# Altium footprint library lamp_controller.PcbLib: 67 footprints (part 3 of 5)
Each footprint in its own frame and in the unit in brackets; x right, y up, seen from the top. Pads: shape width x height; smd on the part's side, far side on the other; paste and mask are expansions set on the pad; w line width, h text height; cw(c..) or ccw(c..) is an arc to the next point about the centre after c.
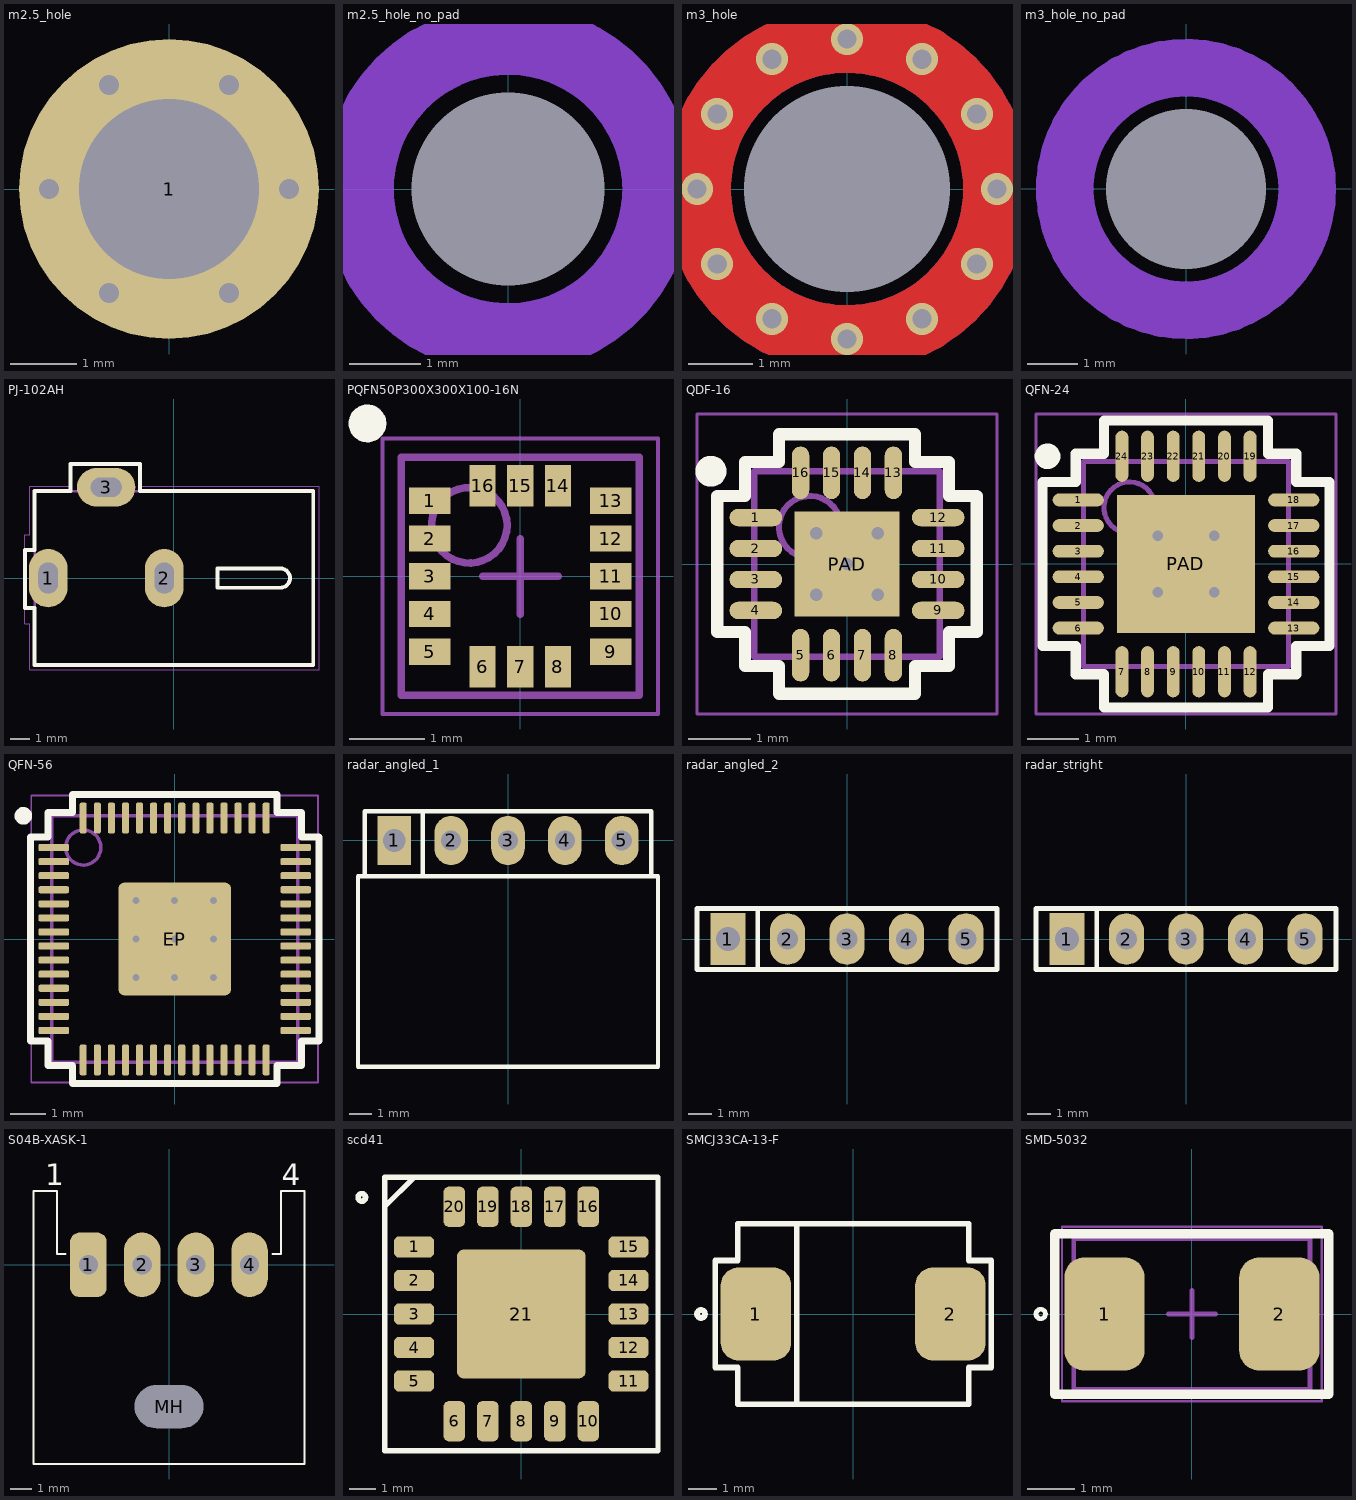
[diagram p2: the footprints below, top view; thin cyan lines are the x and y axes]

## m2.5_hole [mm] "M2.5 hole, with via stitching"
pads (1):
  round 4.5 hole 2.7 unplated mask+1.25: 1(0,0)
via -0.9,-1.559 diameter 0.5 hole 0.3
via 0.9,-1.559 diameter 0.5 hole 0.3
via 1.8,0 diameter 0.5 hole 0.3
via 0.9,1.559 diameter 0.5 hole 0.3
via -0.9,1.559 diameter 0.5 hole 0.3
via -1.8,0 diameter 0.5 hole 0.3

## m2.5_hole_no_pad [mm] "M2.5 hole, no pad"
pads (1):
  round 0 hole 2.7 unplated mask+1.25: ""(0,0)
Top Layer keep-out:
  circle w1: c0,0 r2.1
Bottom Layer keep-out:
  circle w1: c0,0 r2.1

## m3_hole [mm] "M3 hole, with via stitching"
pads (2):
  round 0.1 smd: 1(0,-2.2)
  round 0 hole 3.2 unplated mask+1.25: 1(0,0)
via 0,2.33 diameter 0.5 hole 0.3
via 0,-2.33 diameter 0.5 hole 0.3
via 2.018,1.165 diameter 0.5 hole 0.3
via -2.018,-1.165 diameter 0.5 hole 0.3
via -2.018,1.165 diameter 0.5 hole 0.3
via 2.018,-1.165 diameter 0.5 hole 0.3
via 1.165,2.018 diameter 0.5 hole 0.3
via -1.165,-2.018 diameter 0.5 hole 0.3
via 2.33,0 diameter 0.5 hole 0.3
via -2.33,0 diameter 0.5 hole 0.3
via -1.165,2.018 diameter 0.5 hole 0.3
via 1.165,-2.018 diameter 0.5 hole 0.3
Top Layer:
  circle w1.05: c0,0 r2.33
Bottom Layer:
  circle w1.05: c0,0 r2.33
Multi-Layer:
  pour cut-out: 0,-1.8 0.177,-1.8 0.526,-1.731 0.854,-1.596 1.149,-1.399 1.4,-1.148 1.598,-0.853 1.734,-0.525 1.803,-0.177 1.803,0 1.8,0 1.8,0.177 1.731,0.525 1.596,0.852 1.4,1.147 1.149,1.397 0.855,1.595 0.528,1.73 0.18,1.8 0.003,1.8 0,1.8 -0.177,1.8 -0.524,1.73 -0.852,1.595 -1.146,1.397 -1.396,1.147 -1.593,0.852 -1.728,0.525 -1.797,0.177 -1.797,0 -1.8,0 -1.8,-0.177 -1.73,-0.525 -1.594,-0.853 -1.397,-1.148 -1.146,-1.399 -0.85,-1.596 -0.522,-1.731 -0.174,-1.8 0.003,-1.8

## m3_hole_no_pad [mm] "M3 hole, no pad"
pads (1):
  round 0 hole 3.2 unplated mask+1.3: ""(0,0)
Top Layer keep-out:
  circle w1.15: c0,0 r2.425
Bottom Layer keep-out:
  circle w1.15: c0,0 r2.425
Multi-Layer:
  pour cut-out: 0,-3 0.197,-3 0.586,-2.949 0.966,-2.847 1.33,-2.696 1.67,-2.5 1.982,-2.26 2.26,-1.982 2.5,-1.67 2.696,-1.33 2.847,-0.966 2.949,-0.587 3,-0.197 3,0 3,0.197 2.949,0.586 2.847,0.966 2.696,1.33 2.5,1.67 2.26,1.982 1.982,2.26 1.67,2.5 1.33,2.696 0.966,2.847 0.586,2.949 0.197,3 0,3 -0.197,3 -0.587,2.949 -0.966,2.847 -1.33,2.696 -1.67,2.5 -1.982,2.26 -2.26,1.982 -2.5,1.67 -2.696,1.33 -2.847,0.966 -2.949,0.587 -3,0.197 -3,0 -3,-0.197 -2.949,-0.587 -2.847,-0.966 -2.696,-1.33 -2.5,-1.67 -2.26,-1.982 -1.982,-2.26 -1.67,-2.5 -1.33,-2.696 -0.966,-2.847 -0.587,-2.949 -0.197,-3

## PJ-102AH [mm]
height 11
pads (3):
  oval 2x3.016 hole 1 slot 1.6 at 90 deg: 1(-6.5,0) 2(-0.5,0)
  oval 3.016x2 hole 1 slot 1.6 at 0 deg: 3(-3.5,4.7)
Top Overlay:
  lines w0.2: 5.5,0.5 cw(c5.5,0) 6,0 cw(c5.5,0) 5.5,-0.5 2.25,-0.5 2.25,0.5 5.5,0.5 ; 5.5,0.5 5.5,0.5 ; -7.7,-1.55 -7.2,-1.55 -7.2,-4.5 7.2,-4.5 7.2,4.5 -1.75,4.5 -1.75,5.9 -5.35,5.9 -5.35,4.5 -7.2,4.5 -7.2,1.45 -7.7,1.45 -7.7,-1.55
Mechanical 1:
  lines w0: -7,-0.8 -6,-0.8 -6,0.8 -7,0.8 -7,-0.8 ; -4.3,4.2 -4.3,5.2 -2.7,5.2 -2.7,4.2 -4.3,4.2 ; -1,-0.8 0,-0.8 0,0.8 -1,0.8 -1,-0.8
Mechanical 13:
  lines w0.127: -7.2,-4.5 7.2,-4.5 ; -7.2,-4.5 -7.2,4.5 ; -7.2,-4.5 7.2,-4.5 ; -7.2,-4.5 -7.2,4.5 ; -7.2,4.5 7.2,4.5 ; -7.2,4.5 7.2,4.5 ; 7.2,-4.5 7.2,4.5 ; 7.2,-4.5 7.2,4.5
Mechanical 15:
  lines w0.05: -7.7,-2.35 -7.7,2.25 -7.45,2.25 -7.45,4.75 -5.35,4.75 -5.35,5.9 -1.65,5.9 -1.65,4.75 7.5,4.75 7.5,-4.75 -7.45,-4.75 -7.45,-2.35 -7.7,-2.35
3D body "pj-102ah.sldprt": height 11, standoff -3.5, extent -7.2,-4.5 7.2,4.9

## PQFN50P300X300X100-16N [mm] "PQFN, 16-Leads, Body 3.00x3.00mm, Pitch 0.50mm, IPC Medium Density"
height 1
pads (16):
  rect 0.55x0.35 smd: 1(-1.2,1) 2(-1.2,0.5) 3(-1.2,0) 4(-1.2,-0.5) 5(-1.2,-1) 9(1.2,-1) 10(1.2,-0.5) 11(1.2,0) 12(1.2,0.5) 13(1.2,1)
  rect 0.35x0.55 smd: 6(-0.5,-1.2) 7(0,-1.2) 8(0.5,-1.2) 14(0.5,1.2) 15(0,1.2) 16(-0.5,1.2)
Top Overlay:
  circle w0.25: c-2.025,2.025 r0.125
Top Courtyard:
  lines w0.05: -1.825,-1.825 1.825,-1.825 1.825,1.825 -1.825,1.825 -1.825,-1.825
  lines w0.1: -0.5,0 0.5,0 ; 0,-0.5 0,0.5
Mechanical 13:
  circle w0.1: c-0.675,0.675 r0.5
  lines w0.1: -1.575,-1.575 1.575,-1.575 1.575,1.575 -1.575,1.575 -1.575,-1.575
3D body: height 1, standoff 0, extent -1.575,-1.575 1.575,1.575

## QDF-16 [mm] "QFN, 16-Leads, Body 3.00x3.00mm, Pitch 0.50mm, Thermal Pad 1.70x1.70mm, IPC Low Density"
height 0.8
pads (17):
  oval 0.85x0.28 smd: 1(-1.475,0.75) 2(-1.475,0.25) 3(-1.475,-0.25) 4(-1.475,-0.75) 9(1.475,-0.75) 10(1.475,-0.25) 11(1.475,0.25) 12(1.475,0.75)
  oval 0.28x0.85 smd: 5(-0.75,-1.475) 6(-0.25,-1.475) 7(0.25,-1.475) 8(0.75,-1.475) 13(0.75,1.475) 14(0.25,1.475) 15(-0.25,1.475) 16(-0.75,1.475)
  rect 1.7x1.7 smd: PAD(0,0)
via 0,0 diameter 0.45 hole 0.2
via 0.5,0.5 diameter 0.45 hole 0.2
via 0.5,-0.5 diameter 0.45 hole 0.2
via -0.5,-0.5 diameter 0.45 hole 0.2
via -0.5,0.5 diameter 0.45 hole 0.2
Top Overlay:
  circle w0.25: c-2.2,1.5 r0.125
  lines w0.2: -2.1,-1.1 -1.65,-1.1 -1.65,-1.65 -1.1,-1.65 -1.1,-2.1 1.1,-2.1 1.1,-1.65 1.65,-1.65 1.65,-1.1 2.1,-1.1 2.1,1.1 1.65,1.1 1.65,1.65 1.1,1.65 1.1,2.1 -1.1,2.1 -1.1,1.65 -1.65,1.65 -1.65,1.1 -2.1,1.1 -2.1,-1.1
Top Courtyard:
  lines w0.05: -2.425,-2.425 2.425,-2.425 2.425,2.425 -2.425,2.425 -2.425,-2.425
  lines w0.1: -0.5,0 0.5,0 ; 0,-0.5 0,0.5
Mechanical 13:
  circle w0.1: c-0.6,0.6 r0.5
  lines w0.1: -1.5,-1.5 1.5,-1.5 1.5,1.5 -1.5,1.5 -1.5,-1.5
3D body "QDF-16.step": height 0.8, standoff 0, extent -1.501,-1.501 1.501,1.501

## QFN-24 [mm] "QFN, 24-Leads, Body 4.00x4.00mm, Pitch 0.50mm, Thermal Pad 2.70x2.70mm, IPC Low Density"
height 1
pads (25):
  oval 1x0.25 smd: 1(-2.1,1.25) 2(-2.1,0.75) 3(-2.1,0.25) 4(-2.1,-0.25) 5(-2.1,-0.75) 6(-2.1,-1.25) 13(2.1,-1.25) 14(2.1,-0.75) 15(2.1,-0.25) 16(2.1,0.25) 17(2.1,0.75) 18(2.1,1.25)
  oval 0.25x1 smd: 7(-1.25,-2.1) 8(-0.75,-2.1) 9(-0.25,-2.1) 10(0.25,-2.1) 11(0.75,-2.1) 12(1.25,-2.1) 19(1.25,2.1) 20(0.75,2.1) 21(0.25,2.1) 22(-0.25,2.1) 23(-0.75,2.1) 24(-1.25,2.1)
  rect 2.7x2.7 smd: PAD(0,0)
via -0.55,0.55 diameter 0.45 hole 0.2
via 0.55,0.55 diameter 0.45 hole 0.2
via -0.55,-0.55 diameter 0.45 hole 0.2
via 0.55,-0.55 diameter 0.45 hole 0.2
Top Overlay:
  circle w0.25: c-2.7,2.1 r0.125
  lines w0.2: -2.8,-1.6 -2.8,1.6 -2.15,1.6 -2.15,2.15 -1.6,2.15 -1.6,2.8 1.6,2.8 1.6,2.15 2.15,2.15 2.15,1.6 2.8,1.6 2.8,-1.6 2.15,-1.6 2.15,-2.15 1.6,-2.15 1.6,-2.8 -1.6,-2.8 -1.6,-2.15 -2.15,-2.15 -2.15,-1.6 -2.8,-1.6
Top Courtyard:
  lines w0.05: -2.925,-2.925 -2.925,2.925 2.925,2.925 2.925,-2.925 -2.925,-2.925
  lines w0.1: -0.5,0 0.5,0 ; 0,-0.5 0,0.5
Mechanical 13:
  circle w0.1: c-1.1,1.1 r0.5
  lines w0.1: -2,-2 -2,2 2,2 2,-2 -2,-2
3D body "stusb4500.step": height 1.01, standoff 0.01, extent -2,-2 2,2

## QFN-56 [mm]
height 0.9
pads (57):
  rrect50% 0.875x0.2 smd: 1(-3.437,2.6) 2(-3.437,2.2) 3(-3.437,1.8) 4(-3.437,1.4) 5(-3.437,1) 6(-3.437,0.6) 7(-3.437,0.2) 8(-3.437,-0.2) 9(-3.437,-0.6) 10(-3.437,-1) 11(-3.437,-1.4) 12(-3.437,-1.8) 13(-3.437,-2.2) 14(-3.437,-2.6) 29(3.438,-2.6) 30(3.438,-2.2) 31(3.438,-1.8) 32(3.438,-1.4) 33(3.438,-1) 34(3.438,-0.6) 35(3.438,-0.2) 36(3.438,0.2) 37(3.438,0.6) 38(3.438,1) 39(3.438,1.4) 40(3.438,1.8) 41(3.438,2.2) 42(3.438,2.6)
  rrect50% 0.2x0.875 smd: 15(-2.6,-3.438) 16(-2.2,-3.438) 17(-1.8,-3.438) 18(-1.4,-3.438) 19(-1,-3.438) 20(-0.6,-3.438) 21(-0.2,-3.438) 22(0.2,-3.438) 23(0.6,-3.438) 24(1,-3.438) 25(1.4,-3.438) 26(1.8,-3.438) 27(2.2,-3.438) 28(2.6,-3.438) 43(2.6,3.437) 44(2.2,3.437) 45(1.8,3.437) 46(1.4,3.437) 47(1,3.437) 48(0.6,3.437) 49(0.2,3.437) 50(-0.2,3.437) 51(-0.6,3.437) 52(-1,3.437) 53(-1.4,3.437) 54(-1.8,3.437) 55(-2.2,3.437) 56(-2.6,3.437)
  rrect10% 3.2x3.2 smd: EP(0,0)
via -1.1,1.1 diameter 0.5 hole 0.2
via 0,1.1 diameter 0.5 hole 0.2
via 1.1,1.1 diameter 0.5 hole 0.2
via -1.1,0 diameter 0.5 hole 0.2
via 0,0 diameter 0.5 hole 0.2
via 1.1,0 diameter 0.5 hole 0.2
via -1.1,-1.1 diameter 0.5 hole 0.2
via 0,-1.1 diameter 0.5 hole 0.2
via 1.1,-1.1 diameter 0.5 hole 0.2
Top Overlay:
  circle w0.25: c-4.3,3.5 r0.125
  lines w0.2: -4.1,-2.9 -4.1,2.9 -3.6,2.9 -3.6,3.6 -2.9,3.6 -2.9,4.1 2.9,4.1 2.9,3.6 3.6,3.6 3.6,2.9 4.1,2.9 4.1,-2.9 3.6,-2.9 3.6,-3.6 2.9,-3.6 2.9,-4.1 -2.9,-4.1 -2.9,-3.6 -3.6,-3.6 -3.6,-2.9 -4.1,-2.9
Top Courtyard:
  lines w0.05: -4.075,-4.075 -4.075,4.075 4.075,4.075 4.075,-4.075 -4.075,-4.075
  lines w0.1: -0.5,0 0.5,0 ; 0,-0.5 0,0.5
Mechanical 13:
  circle w0.1: c-2.6,2.6 r0.5
  lines w0.1: -3.5,-3.5 -3.5,3.5 3.5,3.5 3.5,-3.5 -3.5,-3.5
3D body "QFN-56.step": height 0.9, standoff 0, extent -3.501,-3.501 3.501,3.501

## radar_angled_1 [mm] "5-pin 0.1\" header"
pads (5):
  rect 1.5x2.2 hole 1.02: 1(-5.08,0)
  oval 1.5x2.2 hole 0.9: 2(-2.54,0) 3(0,0) 4(2.54,0) 5(5.08,0)
Top Overlay:
  lines w0.2: -3.81,-1.6 -3.81,1.3 ; -6.4,-1.6 -6.7,-1.6 -6.7,-10.1 6.7,-10.1 6.7,-1.6 6.4,-1.6 ; -6.4,-1.6 6.4,-1.6 ; -6.4,-1.6 -6.4,1.3 6.4,1.3 6.4,-1.6
Bottom Overlay:
  circle w0.2: c-0.5,-7 r0.101
  lines w0.2: -1.4,-7 ccw(c-0.5,-7) -0.5,-7.9 ; -1,-6.9 ccw(c-0.5,-7) -0.5,-7.51 ; -0.5,-7 0,-6.5 ; 1.1,-5.6 2.3,-5.2 2.3,-7 1.4,-6.5 ; -0.962,-5.538 cw(c0,-6.5) 0.962,-7.462 -0.962,-5.538
  text "TX" at -4.6,-1.7 h1
  text "RX" at -2.06,-1.7 h1
  text "OUT" at 0.48,-1.7 h1
  text "GND" at 3.02,-1.7 h1
  text "VCC" at 5.56,-1.7 h1
3D body "radar_angled_1.step": height 2.76, standoff -13.24, extent -11.05,-15.64 11.05,0.2

## radar_angled_2 [mm] "5-pin 0.1\" header"
pads (5):
  rect 1.5x2.2 hole 1.02: 1(-5.08,0)
  oval 1.5x2.2 hole 0.9: 2(-2.54,0) 3(0,0) 4(2.54,0) 5(5.08,0)
Top Overlay:
  lines w0.2: -3.81,-1.27 -3.81,1.3 ; -6.4,-1.3 6.4,-1.3 6.4,1.3 -6.4,1.3 -6.4,-1.3
3D body "radar_angled_2.step": height 15.76, standoff -3.08, extent -11.05,-0.2 11.05,15.64

## radar_stright [mm] "5-pin 0.1\" header"
pads (5):
  rect 1.5x2.2 hole 1.02: 1(-5.08,0)
  oval 1.5x2.2 hole 0.9: 2(-2.54,0) 3(0,0) 4(2.54,0) 5(5.08,0)
Top Overlay:
  lines w0.2: -3.81,-1.27 -3.81,1.3 ; -6.4,-1.3 -6.4,1.3 6.4,1.3 6.4,-1.3 -6.4,-1.3
3D body "radar_straight.step": height 14.05, standoff -3.09, extent -11.05,-14.5 11.05,1.5

## S04B-XASK-1 [mm] "JST XA 2.5mm header, right angle"
pads (5):
  rrect50% 1.7x3 hole 0.9: 1(-3.75,0)
  oval 1.7x3 hole 0.9: 2(-1.25,0) 3(1.25,0) 4(3.75,0)
  oval 3x2 hole 2 slot 3.2 at 0 deg unplated mask+0: MH(0,-6.604)
Top Overlay:
  lines w0.1: -4.826,0.508 -5.207,0.508 -5.207,3.429 -6.3,3.429 -6.3,-9.271 6.3,-9.271 6.3,3.429 5.207,3.429 5.207,0.508 4.826,0.508
  text "4" at 5.255,3.691 h1
  text "1" at -5.755,3.691 h1
3D body "S04B-XASK-1.STEP": height 7.7, standoff -3.4, extent -6.25,-9.253 6.25,3.347

## scd41 [mm]
pads (21):
  rrect50% 1.5x0.8 smd: 1(-4,2.5) 2(-4,1.25) 3(-4,0) 4(-4,-1.25) 5(-4,-2.5) 11(4,-2.5) 12(4,-1.25) 13(4,0) 14(4,1.25) 15(4,2.5)
  rrect50% 0.8x1.5 smd: 6(-2.5,-4) 7(-1.25,-4) 8(0,-4) 9(1.25,-4) 10(2.5,-4) 16(2.5,4) 17(1.25,4) 18(0,4) 19(-1.25,4) 20(-2.5,4)
  rrect10% 4.8x4.8 smd paste-2539.97: 21(0,0)
Top Overlay:
  circle w0.2: c-5.95,4.35 r0.141
  lines w0.2: -5.1,4 -4,5.1 ; -5.1,-5.1 -5.1,5.1 5.1,5.1 5.1,-5.1 -5.1,-5.1
Top Paste:
  region: 2.15,-0.4 2.15,-2.1 2.15,-2.11 2.142,-2.128 2.128,-2.142 2.11,-2.15 2.1,-2.15 0.4,-2.15 0.39,-2.15 0.372,-2.142 0.358,-2.128 0.35,-2.11 0.35,-2.1 0.35,-0.4 0.35,-0.39 0.358,-0.372 0.372,-0.358 0.39,-0.35 0.4,-0.35 2.1,-0.35 2.11,-0.35 2.128,-0.358 2.142,-0.372 2.15,-0.39
  region: -2.15,0.4 -2.15,2.1 -2.15,2.11 -2.142,2.128 -2.128,2.142 -2.11,2.15 -2.1,2.15 -0.4,2.15 -0.39,2.15 -0.372,2.142 -0.358,2.128 -0.35,2.11 -0.35,2.1 -0.35,0.4 -0.35,0.39 -0.358,0.372 -0.372,0.358 -0.39,0.35 -0.4,0.35 -2.1,0.35 -2.11,0.35 -2.128,0.358 -2.142,0.372 -2.15,0.39
  region: -0.4,-2.15 -2.1,-2.15 -2.11,-2.15 -2.128,-2.142 -2.142,-2.128 -2.15,-2.11 -2.15,-2.1 -2.15,-0.4 -2.15,-0.39 -2.142,-0.372 -2.128,-0.358 -2.11,-0.35 -2.1,-0.35 -0.4,-0.35 -0.39,-0.35 -0.372,-0.358 -0.358,-0.372 -0.35,-0.39 -0.35,-0.4 -0.35,-2.1 -0.35,-2.11 -0.358,-2.128 -0.372,-2.142 -0.39,-2.15
  region: 0.4,2.15 2.1,2.15 2.11,2.15 2.128,2.142 2.142,2.128 2.15,2.11 2.15,2.1 2.15,0.4 2.15,0.39 2.142,0.372 2.128,0.358 2.11,0.35 2.1,0.35 0.4,0.35 0.39,0.35 0.372,0.358 0.358,0.372 0.35,0.39 0.35,0.4 0.35,2.1 0.35,2.11 0.358,2.128 0.372,2.142 0.39,2.15
3D body "scd41_co2_sensor.step": height 6.32, standoff 0.01, extent -5.05,-5.05 5.05,5.05

## SMCJ33CA-13-F [mm]
pads (2):
  rrect50% 2.5x3.3 smd: 1(-3.45,0) 2(3.45,0)
Top Overlay:
  circle w0.2: c-5.4,0 r0.141
  lines w0.2: -2,-3.2 -2,3.2 ; -4.9,-1.9 -4.9,1.9 -4.1,1.9 -4.1,3.2 4.1,3.2 4.1,1.9 4.9,1.9 4.9,-1.9 4.1,-1.9 4.1,-3.2 -4.1,-3.2 -4.1,-1.9 -4.9,-1.9
3D body "smcj33ca-13-f_tvs.step": height 2.45, standoff 0, extent -4.065,-3.11 4.065,3.11

## SMD-5032 [mm]
height 1.35
pads (2):
  rrect50% 1.7x2.4 smd: 1(-1.85,0) 2(1.85,0)
Top Overlay:
  circle w0.1: c-3.2,0 r0.1
  lines w0.2: -2.9,-1.7 2.9,-1.7 2.9,1.7 -2.9,1.7 -2.9,-1.7
Top Courtyard:
  lines w0.05: -2.75,-1.85 -2.75,1.85 2.75,1.85 2.75,-1.85 -2.75,-1.85
  lines w0.1: -0.5,0 0.5,0 ; 0,-0.5 0,0.5
Mechanical 13:
  lines w0.1: -2.5,-1.6 -2.5,1.6 2.5,1.6 2.5,-1.6 -2.5,-1.6
3D body "SMD-5032.step": height 1.35, standoff 0, extent -2.5,-1.6 2.5,1.6